# Altium footprint library PASSIVE_THD.PCBLIB: 84 footprints (part 5 of 6)
Each footprint in its own frame and in the unit in brackets; x right, y up, seen from the top. Pads: shape width x height; smd on the part's side, far side on the other; paste and mask are expansions set on the pad; w line width, h text height; cw(c..) or ccw(c..) is an arc to the next point about the centre after c.
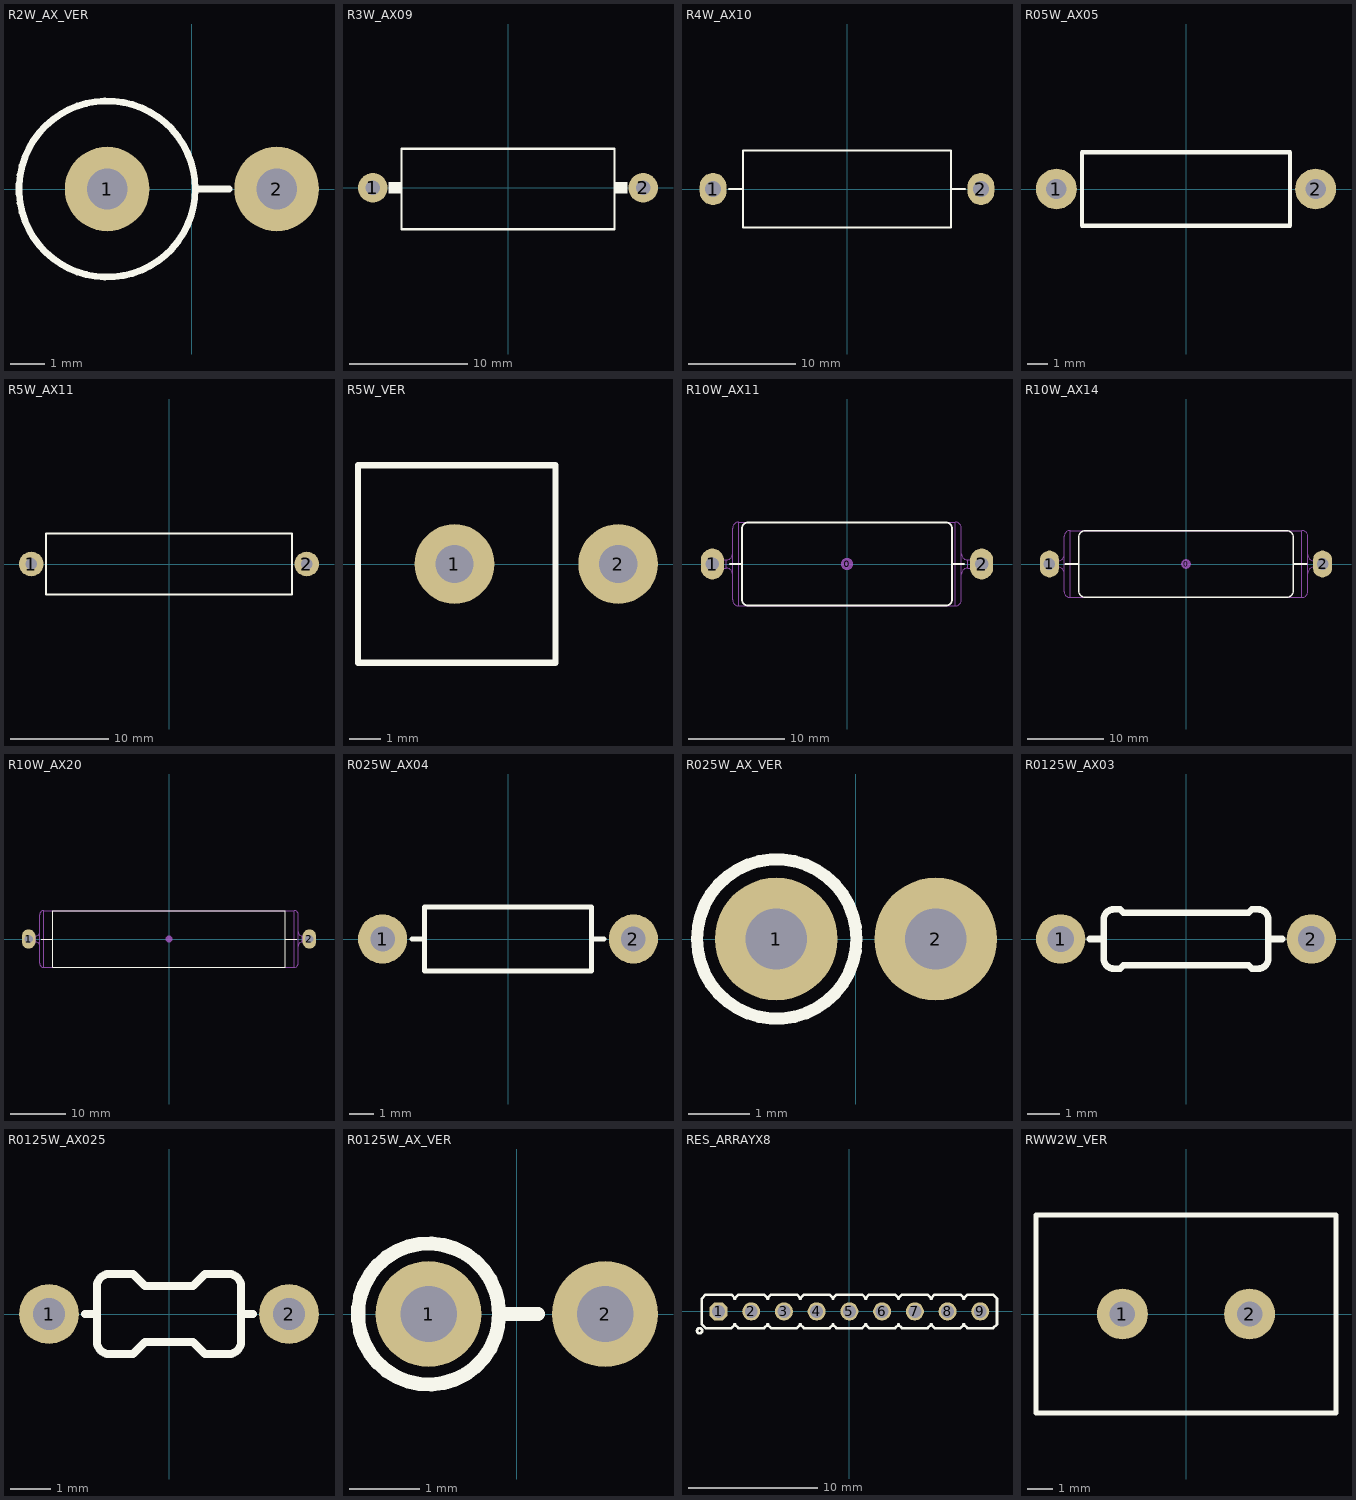
[diagram p4: the footprints below, top view; thin cyan lines are the x and y axes]

## R2W_AX_VER [mm] "RESISTOR 2 WATT, AXIAL0.8"
height 5.5
pads (2):
  round 2.5 hole 1.2: 1(-2.5,0) 2(2.5,0)
TopOverlay:
  circle w0.2: c-2.5,0 r2.6
  lines w0.2: 0.191,0 1.1,0
3D body "User Library-RESAD500W80L1600D500_2W.STEP": height 20.3, standoff -3.1, extent -5,-2.5 2.9,2.5

## R3W_AX09 [mm] "RESISTOR 3 WATT, AXIAL0.9"
height 6.5
pads (2):
  round 2.5 hole 1.2: 1(-11.43,0) 2(11.43,0)
TopOverlay:
  region: 10.1,0.5 9,0.5 9,-0.5 10.1,-0.5
  rectangle: -10.1,-0.5 -9,0.5
  lines w0.2: -9,-3.5 -9,3.3 9,3.3 9,-3.5 -9,-3.5
3D body "User Library-RES-3W.STEP": height 6.5, standoff -3, extent -11.83,-3.3 11.83,3.2

## R4W_AX10 [mm] "RESISTOR 4 WATT, AXIAL1.0"
pads (2):
  oval 2.5x3 hole 1.5: 1(-12.5,0) 2(12.5,0)
TopOverlay:
  lines w0.2: -11,0 -9.7,0 ; 9.7,0 11,0 ; -9.7,-3.6 9.7,-3.6 9.7,3.6 -9.7,3.6 -9.7,-3.6
3D body "User Library-AXIAL_RESISTOR(4W)_HORIZONTAL.step": height 7.21, standoff -3.2, extent -13.1,-3.5 13.1,3.5

## R05W_AX05 [mm] "RESISTOR 0.5 WATT, AXIAL0.5"
height 3.5
pads (2):
  round 2 hole 1: 1(-6.35,0) 2(6.35,0)
TopOverlay:
  lines w0.2: -5.1,-1.8 5.1,-1.8 5.1,1.8 -5.1,1.8 -5.1,-1.8
3D body "User Library-RES-1_5W.STEP": height 3.5, standoff -3, extent -6.62,-1.75 6.62,1.75

## R5W_AX11 [mm] "RESISTOR 5 WATT, AXIAL1.1"
pads (2):
  round 2.5 hole 1.2: 1(-13.97,0) 2(13.97,0)
TopOverlay:
  lines w0.2: -12.5,-3.1 12.5,-3.1 12.5,3.1 -12.5,3.1 -12.5,-3.1
3D body "User Library-RES-5W.STEP": height 7.01, standoff -5, extent -14.34,-3 14.4,3

## R5W_VER [mm] "RESISTOR 5 WATT, AXIAL1.1"
pads (2):
  round 2.5 hole 1.2: 1(-13.97,0) 2(-8.83,0)
TopOverlay:
  lines w0.2: -17,-3.1 -17,3.1 -10.8,3.1 -10.8,-3.1 -17,-3.1
3D body "User Library-RES-5W-Vert.STEP": height 26.6, standoff -3, extent -16.94,-3.005 -8.46,3.009

## R10W_AX11 [mm] "RESISTOR 10 WATT, AXIAL1.1"
height 8.712
pads (3):
  round 1.27 on Mech15: 0(0,0)
  oval 2.4x3.2 hole 1.4: 1(-14,0) 2(14,0)
TopOverlay:
  lines w0.2: -12.192,0 -10.922,0 ; 10.922,0 12.192,0 ; -10.922,-3.683 ccw(c-10.287,-3.683) -10.287,-4.318 10.287,-4.318 ccw(c10.287,-3.683) 10.922,-3.683 10.922,3.683 ccw(c10.287,3.683) 10.287,4.318 -10.287,4.318 ccw(c-10.287,3.683) -10.922,3.683 -10.922,-3.683
Mechanical13:
  lines w0.127: -13.106,-0.432 -13.106,0.432 ; -12.535,-0.429 -12.535,0.432 ; -11.9,-1.067 ccw(c-12.535,-1.067) -12.535,-0.432 -13.97,-0.432 cw(c-13.97,0) -13.97,0.432 -12.535,0.432 ; -11.9,1.067 cw(c-12.535,1.067) -12.535,0.432 ; 11.9,-1.067 cw(c12.535,-1.067) 12.535,-0.432 ; 11.9,1.067 ccw(c12.535,1.067) 12.535,0.432 13.97,0.432 cw(c13.97,0) 13.97,-0.432 12.535,-0.432 ; 12.535,0.429 12.535,-0.432 ; 13.106,-0.432 13.106,0.432 ; -11.265,-4.356 cw(c-11.265,-3.721) -11.9,-3.721 -11.9,3.721 cw(c-11.265,3.721) -11.265,4.356 ; -11.265,-4.356 11.265,-4.356 ; -11.265,-4.356 -11.265,4.356 ; -11.265,4.356 11.265,4.356 ; 11.265,-4.356 ccw(c11.265,-3.721) 11.9,-3.721 11.9,3.721 ccw(c11.265,3.721) 11.265,4.356 ; 11.265,-4.356 11.265,4.356
3D body "Power Res MRA-10.STEP": height 8.68, standoff -2.54, extent -14.402,-4.347 14.402,4.348

## R10W_AX14 [mm] "RESISTOR 10 WATT, AXIAL1.4"
height 8.712
pads (3):
  round 1.27 on Mech15: 0(0,0)
  oval 2.5x3.5 hole 1.5: 1(-17.8,0) 2(17.8,0)
TopOverlay:
  lines w0.2: -15.748,0 -13.97,0 ; 13.97,0 15.748,0 ; -13.97,-3.556 ccw(c-13.208,-3.556) -13.208,-4.318 13.208,-4.318 ccw(c13.208,-3.556) 13.97,-3.556 13.97,3.556 ccw(c13.208,3.556) 13.208,4.318 -13.208,4.318 ccw(c-13.208,3.556) -13.97,3.556 -13.97,-3.556
Mechanical13:
  lines w0.127: -16.916,-0.432 -16.916,0.432 ; -15.875,-1.194 ccw(c-16.637,-1.194) -16.637,-0.432 ; -15.875,1.194 cw(c-16.637,1.194) -16.637,0.432 ; 15.875,-1.194 cw(c16.637,-1.194) 16.637,-0.432 ; 15.875,1.194 ccw(c16.637,1.194) 16.637,0.432 ; 16.916,-0.432 16.916,0.432 ; -16.637,-0.432 -17.78,-0.432 cw(c-17.78,0) -17.78,0.432 -16.637,0.432 ; -16.637,-0.432 -16.637,0.432 ; -15.113,-4.356 cw(c-15.113,-3.594) -15.875,-3.594 -15.875,3.594 cw(c-15.113,3.594) -15.113,4.356 ; -15.113,-4.356 15.113,-4.356 ; -15.113,-4.356 -15.113,4.356 ; -15.113,4.356 15.113,4.356 ; 15.113,-4.356 ccw(c15.113,-3.594) 15.875,-3.594 15.875,3.594 ccw(c15.113,3.594) 15.113,4.356 ; 15.113,-4.356 15.113,4.356 ; 16.637,-0.432 17.78,-0.432 ccw(c17.78,0) 17.78,0.432 16.637,0.432 ; 16.637,-0.432 16.637,0.432
3D body "Power Res MRA-12.STEP": height 8.68, standoff -2.54, extent -18.212,-4.347 18.212,4.348

## R10W_AX20 [mm] "RESISTOR 10 WATT, AXIAL2.0"
height 10.312
pads (3):
  round 1.27 on Mech15: 0(0,0)
  oval 2.5x3.5 hole 1.5: 1(-25.4,0) 2(25.4,0)
TopOverlay:
  lines w0.2: -23.114,0 -21.082,0 ; 21.082,0 23.114,0 ; -21.082,-5.08 21.082,-5.08 21.082,5.08 -21.082,5.08 -21.082,-5.08
Mechanical13:
  lines w0.127: -24.333,-0.533 -24.333,0.533 ; -23.393,-1.295 ccw(c-24.155,-1.295) -24.155,-0.533 ; -23.393,1.295 cw(c-24.155,1.295) -24.155,0.533 ; 23.393,-1.295 cw(c24.155,-1.295) 24.155,-0.533 ; 23.393,1.295 ccw(c24.155,1.295) 24.155,0.533 ; 24.333,-0.533 24.333,0.533 ; -24.155,-0.533 -24.155,0.533 ; -24.155,-0.533 -25.4,-0.533 cw(c-25.4,0) -25.4,0.533 -24.155,0.533 ; -22.631,-5.156 cw(c-22.631,-4.394) -23.393,-4.394 -23.393,4.394 cw(c-22.631,4.394) -22.631,5.156 ; -22.631,-5.156 -22.631,5.156 ; -22.631,-5.156 22.631,-5.156 ; -22.631,5.156 22.631,5.156 ; 22.631,-5.156 ccw(c22.631,-4.394) 23.393,-4.394 23.393,4.394 ccw(c22.631,4.394) 22.631,5.156 ; 22.631,-5.156 22.631,5.156 ; 24.155,-0.533 24.155,0.533 ; 24.155,-0.533 25.4,-0.533 ccw(c25.4,0) 25.4,0.533 24.155,0.533
3D body "Power Res RS010.STEP": height 10.27, standoff -2.54, extent -25.933,-5.146 25.933,5.146

## R025W_AX04 [mm] "RESISTOR 1/4 WATT, AXIAL0.4"
pads (2):
  round 2 hole 1: 1(-5.1,0) 2(5.1,0)
TopOverlay:
  lines w0.2: -3.9,0 -3.4,0 ; 3.375,-1.3 -3.4,-1.3 -3.4,1.3 3.375,1.3 ; 3.4,-1.3 3.4,1.3 ; 3.4,0 3.9,0
3D body "RESTH_Axial-0.4.STEP": height 2.6, standoff -2.54, extent -5.38,-1.277 5.38,1.277

## R025W_AX_VER [mm] "RESISTOR 1/4 WATT, AXIAL0.4"
pads (2):
  round 2 hole 1: 1(-1.3,0) 2(1.3,0)
TopOverlay:
  circle w0.2: c-1.29,0 r1.3
3D body "User Library-RESAD250W60L650D230_0_25W.STEP": height 9.83, standoff -2.47, extent -2.436,-1.15 1.51,1.15

## R0125W_AX03 [mm] "RESISTOR 1/8 WATT, AXIAL0.3 INCH SPACING"
pads (2):
  round 1.5 hole 0.8: 1(-3.81,0) 2(3.81,0)
TopOverlay:
  lines w0.2: -2.921,0 -2.5,0 ; 2.5,0 2.921,0 ; -2.5,-0.6 ccw(c-2.2,-0.6) -2.2,-0.9 -2,-0.9 -1.9,-0.8 1.9,-0.8 2,-0.9 2.2,-0.9 ccw(c2.2,-0.6) 2.5,-0.6 2.5,0.6 ccw(c2.2,0.6) 2.2,0.9 2,0.9 1.9,0.8 -1.9,0.8 -2,0.9 -2.2,0.9 ccw(c-2.2,0.6) -2.5,0.6 -2.5,-0.6
3D body "1M.STEP": height 1.85, standoff -3, extent -4.16,-0.85 4.16,0.85

## R0125W_AX025 [mm] "RESISTOR 1/8 WATT, AXIAL0.25"
pads (2):
  round 1.5 hole 0.8: 1(-3,0) 2(3,0)
TopOverlay:
  lines w0.2: -2.1,0 -1.8,0 ; 1.8,0 2.1,0 ; -1.8,-0.7 ccw(c-1.5,-0.7) -1.5,-1 -0.9,-1 -0.6,-0.7 0.6,-0.7 0.9,-1 1.5,-1 ccw(c1.5,-0.7) 1.8,-0.7 1.8,0.7 ccw(c1.5,0.7) 1.5,1 0.9,1 0.6,0.7 -0.6,0.7 -0.9,1 -1.5,1 ccw(c-1.5,0.7) -1.8,0.7 -1.8,-0.7
3D body "User Library-Res_1-8w_1_0.step": height 1.9, standoff -2, extent -3.2,-0.9 3.2,0.9

## R0125W_AX_VER [mm] "RESISTOR 1/8 WATT, AXIAL0.25"
pads (2):
  round 1.5 hole 0.8: 1(-1.25,0) 2(1.25,0)
TopOverlay:
  circle w0.2: c-1.25,0 r1
  lines w0.2: -0.25,0 0.3,0
3D body "User Library-RESAD250W50L320D180_0_125W.STEP": height 6.65, standoff -2.6, extent -2.15,-0.9 1.5,0.9

## RES_ARRAYX8 [mm]
pads (9):
  oct 1.4x1.4 / inner oct 1.4x1.4 / far side oct 1.4x2.2 hole 1 mask+0.1: 1(-10.16,0)
  round 1.4 / inner round 1.4 / far side oval 1.4x2.2 hole 1 mask+0.1: 2(-7.62,0) 3(-5.08,0) 4(-2.54,0) 5(0,0) 6(2.54,0) 7(5.08,0) 8(7.62,0) 9(10.16,0)
TopOverlay:
  circle w0.2: c-11.63,-1.5 r0.2
  lines w0.2: -8.92,-1 -8.62,-1.3 -6.62,-1.3 -6.32,-1 ; -8.92,1 -8.62,1.3 -6.62,1.3 -6.32,1 ; -8.86,-1 -9.16,-1.3 -11.16,-1.3 -11.46,-1 -11.46,1 -11.16,1.3 -9.16,1.3 -8.86,1 ; -6.38,-1 -6.08,-1.3 -4.08,-1.3 -3.78,-1 ; -6.38,1 -6.08,1.3 -4.08,1.3 -3.78,1 ; -3.84,-1 -3.54,-1.3 -1.54,-1.3 -1.24,-1 ; -3.84,1 -3.54,1.3 -1.54,1.3 -1.24,1 ; -1.3,-1 -1,-1.3 1,-1.3 1.3,-1 ; -1.3,1 -1,1.3 1,1.3 1.3,1 ; 1.24,-1 1.54,-1.3 3.54,-1.3 3.84,-1 ; 1.24,1 1.54,1.3 3.54,1.3 3.84,1 ; 3.78,-1 4.08,-1.3 6.08,-1.3 6.38,-1 ; 3.78,1 4.08,1.3 6.08,1.3 6.38,1 ; 6.32,-1 6.62,-1.3 8.62,-1.3 8.92,-1 ; 6.32,1 6.62,1.3 8.62,1.3 8.92,1 ; 8.86,-1 9.16,-1.3 11.16,-1.3 11.46,-1 11.46,1 11.16,1.3 9.16,1.3 8.86,1
3D body "User Library-Resistor Pack 8.STEP": height 6.43, standoff -2, extent -11.405,-1.3 11.405,1.2

## RWW2W_VER [mm] "RESISTOR 2 WATT, Ceramic Wirewound"
pads (2):
  round 2 hole 1: 1(-2.5,0) 2(2.5,0)
TopOverlay:
  lines w0.2: -5.9,-3.9 5.9,-3.9 5.9,3.9 -5.9,3.9 -5.9,-3.9
3D body "User Library-Cement Power Resistor SQM-02 2W 4R3.step": height 20.5, standoff -5, extent -5.75,-3.75 5.75,3.75